# Altium footprint library texas.PCBLIB: 168 footprints (part 5 of 14)
Each footprint in its own frame and in the unit in brackets; x right, y up, seen from the top. Pads: shape width x height; smd on the part's side, far side on the other; paste and mask are expansions set on the pad; w line width, h text height; cw(c..) or ccw(c..) is an arc to the next point about the centre after c.
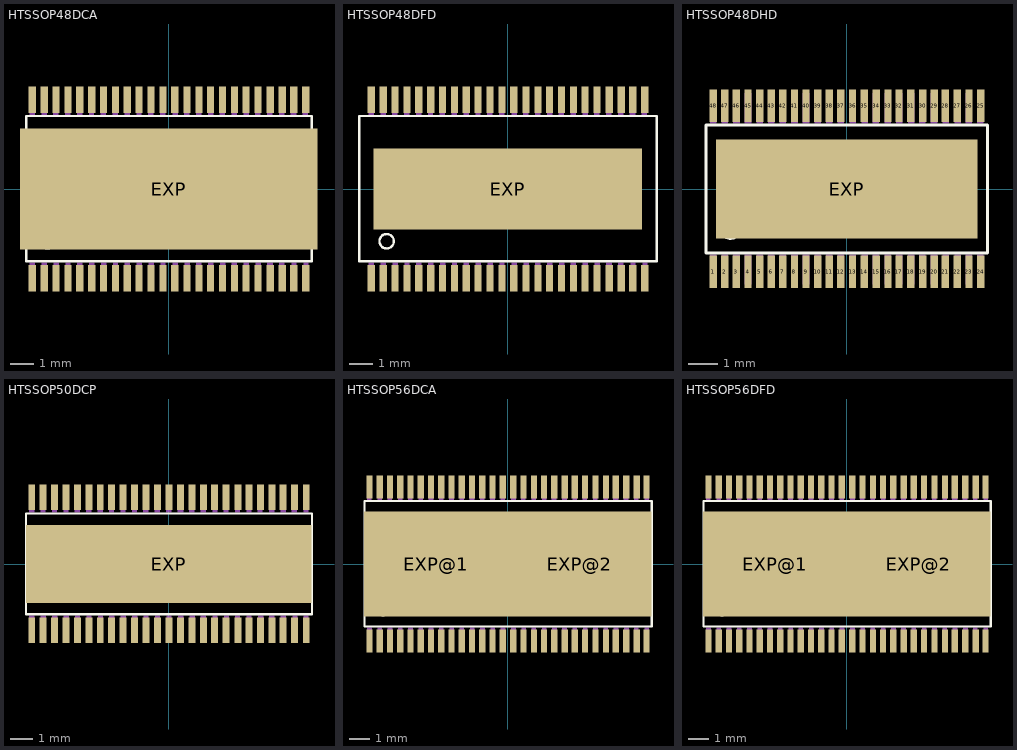
[diagram p4: the footprints below, top view; thin cyan lines are the x and y axes]

## HTSSOP48DCA [mil]
pads (49):
  rect 12x44 smd: 1(-226.38,-147.64) 2(-206.69,-147.64) 3(-187.01,-147.64) 4(-167.32,-147.64) 5(-147.64,-147.64) 6(-127.95,-147.64) 7(-108.27,-147.64) 8(-88.58,-147.64) 9(-68.9,-147.64) 10(-49.21,-147.64) 11(-29.53,-147.64) 12(-9.84,-147.64) 13(10,-147.64) 14(30,-147.64) 15(50,-147.64) 16(69,-147.64) 17(89,-147.64) 18(109,-147.64) 19(128,-147.64) 20(148,-147.64) 21(168,-147.64) 22(188,-147.64) 23(207,-147.64) 24(227,-147.64) 25(227,148) 26(207,148) 27(188,148) 28(168,148) 29(148,148) 30(128,148) 31(109,148) 32(89,148) 33(69,148) 34(50,148) 35(30,148) 36(10,148) 37(-9.84,148) 38(-29.53,148) 39(-49.21,148) 40(-68.9,148) 41(-88.58,148) 42(-108.27,148) 43(-127.95,148) 44(-147.64,148) 45(-167.32,148) 46(-187.01,148) 47(-206.69,148) 48(-226.38,148)
  rect 493x201 smd: EXP(0,0)
Top Overlay:
  circle w4: c-200.79,-86.61 r12
  lines w4: -236.22,-120.08 -236.22,121 237,121 237,-120.08 -236.22,-120.08
Top Paste:
  region: -220.87,169 -231.89,169 -231.89,127 -220.87,127
  region: -201.18,169 -212.2,169 -212.2,127 -201.18,127
  region: -181.5,169 -192.52,169 -192.52,127 -181.5,127
  region: -161.81,169 -172.83,169 -172.83,127 -161.81,127
  region: -142.13,169 -153.15,169 -153.15,127 -142.13,127
  region: -122.44,169 -133.46,169 -133.46,127 -122.44,127
  region: -102.76,169 -113.78,169 -113.78,127 -102.76,127
  region: -83.07,169 -94.09,169 -94.09,127 -83.07,127
  region: -63.39,169 -74.41,169 -74.41,127 -63.39,127
  region: -43.7,169 -54.72,169 -54.72,127 -43.7,127
  region: -24.02,169 -35.04,169 -35.04,127 -24.02,127
  region: -4.33,169 -15.35,169 -15.35,127 -4.33,127
  region: 16,169 5,169 5,127 16,127
  region: 36,169 25,169 25,127 36,127
  region: 55,169 44,169 44,127 55,127
  region: 75,169 64,169 64,127 75,127
  region: 95,169 84,169 84,127 95,127
  region: 114,169 103,169 103,127 114,127
  region: 134,169 123,169 123,127 134,127
  region: 154,169 143,169 143,127 154,127
  region: 173,169 162,169 162,127 173,127
  region: 193,169 182,169 182,127 193,127
  region: 213,169 202,169 202,127 213,127
  region: 232,169 221,169 221,127 232,127
  rectangle: 221,-168.7 232,-126.57
  rectangle: 202,-168.7 213,-126.57
  rectangle: 182,-168.7 193,-126.57
  rectangle: 162,-168.7 173,-126.57
  rectangle: 143,-168.7 154,-126.57
  rectangle: 123,-168.7 134,-126.57
  rectangle: 103,-168.7 114,-126.57
  rectangle: 84,-168.7 95,-126.57
  rectangle: 64,-168.7 75,-126.57
  rectangle: 44,-168.7 55,-126.57
  rectangle: 25,-168.7 36,-126.57
  rectangle: 5,-168.7 16,-126.57
  rectangle: -15.35,-168.7 -4.33,-126.57
  rectangle: -35.04,-168.7 -24.02,-126.57
  rectangle: -54.72,-168.7 -43.7,-126.57
  rectangle: -74.41,-168.7 -63.39,-126.57
  rectangle: -94.09,-168.7 -83.07,-126.57
  rectangle: -113.78,-168.7 -102.76,-126.57
  rectangle: -133.46,-168.7 -122.44,-126.57
  rectangle: -153.15,-168.7 -142.13,-126.57
  rectangle: -172.83,-168.7 -161.81,-126.57
  rectangle: -192.52,-168.7 -181.5,-126.57
  rectangle: -212.2,-168.7 -201.18,-126.57
  rectangle: -231.89,-168.7 -220.87,-126.57
Top Solder:
  rectangle: -245.87,-100.39 247,101
  region: -220.28,170 -232.48,170 -232.48,126 -220.28,126
  region: -200.59,170 -212.8,170 -212.8,126 -200.59,126
  region: -180.91,170 -193.11,170 -193.11,126 -180.91,126
  region: -161.22,170 -173.43,170 -173.43,126 -161.22,126
  region: -141.54,170 -153.74,170 -153.74,126 -141.54,126
  region: -121.85,170 -134.06,170 -134.06,126 -121.85,126
  region: -102.17,170 -114.37,170 -114.37,126 -102.17,126
  region: -82.48,170 -94.69,170 -94.69,126 -82.48,126
  region: -62.8,170 -75,170 -75,126 -62.8,126
  region: -43.11,170 -55.31,170 -55.31,126 -43.11,126
  region: -23.43,170 -35.63,170 -35.63,126 -23.43,126
  region: -3.74,170 -15.94,170 -15.94,126 -3.74,126
  region: 16,170 4,170 4,126 16,126
  region: 36,170 24,170 24,126 36,126
  region: 56,170 44,170 44,126 56,126
  region: 75,170 63,170 63,126 75,126
  region: 95,170 83,170 83,126 95,126
  region: 115,170 103,170 103,126 115,126
  region: 135,170 122,170 122,126 135,126
  region: 154,170 142,170 142,126 154,126
  region: 174,170 162,170 162,126 174,126
  region: 194,170 181,170 181,126 194,126
  region: 213,170 201,170 201,126 213,126
  region: 233,170 221,170 221,126 233,126
  rectangle: 221,-169.49 233,-125.79
  rectangle: 201,-169.49 213,-125.79
  rectangle: 181,-169.49 194,-125.79
  rectangle: 162,-169.49 174,-125.79
  rectangle: 142,-169.49 154,-125.79
  rectangle: 122,-169.49 135,-125.79
  rectangle: 103,-169.49 115,-125.79
  rectangle: 83,-169.49 95,-125.79
  rectangle: 63,-169.49 75,-125.79
  rectangle: 44,-169.49 56,-125.79
  rectangle: 24,-169.49 36,-125.79
  rectangle: 4,-169.49 16,-125.79
  rectangle: -15.94,-169.49 -3.74,-125.79
  rectangle: -35.63,-169.49 -23.43,-125.79
  rectangle: -55.31,-169.49 -43.11,-125.79
  rectangle: -75,-169.49 -62.8,-125.79
  rectangle: -94.69,-169.49 -82.48,-125.79
  rectangle: -114.37,-169.49 -102.17,-125.79
  rectangle: -134.06,-169.49 -121.85,-125.79
  rectangle: -153.74,-169.49 -141.54,-125.79
  rectangle: -173.43,-169.49 -161.22,-125.79
  rectangle: -193.11,-169.49 -180.91,-125.79
  rectangle: -212.8,-169.49 -200.59,-125.79
  rectangle: -232.48,-169.49 -220.28,-125.79
Mechanical 4:
  region: -222.05,164 -231.1,164 -231.1,122 -222.05,122
  region: -202.36,164 -211.42,164 -211.42,122 -202.36,122
  region: -182.68,164 -191.73,164 -191.73,122 -182.68,122
  region: -162.99,164 -172.05,164 -172.05,122 -162.99,122
  region: -143.31,164 -152.36,164 -152.36,122 -143.31,122
  region: -123.62,164 -132.68,164 -132.68,122 -123.62,122
  region: -103.94,164 -112.99,164 -112.99,122 -103.94,122
  region: -84.25,164 -93.31,164 -93.31,122 -84.25,122
  region: -64.57,164 -73.62,164 -73.62,122 -64.57,122
  region: -44.88,164 -53.94,164 -53.94,122 -44.88,122
  region: -25.2,164 -34.25,164 -34.25,122 -25.2,122
  region: -5.51,164 -14.57,164 -14.57,122 -5.51,122
  region: 15,164 6,164 6,122 15,122
  region: 34,164 25,164 25,122 34,122
  region: 54,164 45,164 45,122 54,122
  region: 74,164 65,164 65,122 74,122
  region: 93,164 84,164 84,122 93,122
  region: 113,164 104,164 104,122 113,122
  region: 133,164 124,164 124,122 133,122
  region: 152,164 143,164 143,122 152,122
  region: 172,164 163,164 163,122 172,122
  region: 192,164 183,164 183,122 192,122
  region: 212,164 202,164 202,122 212,122
  region: 231,164 222,164 222,122 231,122
  rectangle: 223,-163.39 232,-121.85
  rectangle: 203,-163.39 212,-121.85
  rectangle: 183,-163.39 192,-121.85
  rectangle: 163,-163.39 173,-121.85
  rectangle: 144,-163.39 153,-121.85
  rectangle: 124,-163.39 133,-121.85
  rectangle: 104,-163.39 113,-121.85
  rectangle: 85,-163.39 94,-121.85
  rectangle: 65,-163.39 74,-121.85
  rectangle: 45,-163.39 54,-121.85
  rectangle: 26,-163.39 35,-121.85
  rectangle: 6,-163.39 15,-121.85
  rectangle: -14.17,-163.39 -5.12,-121.85
  rectangle: -33.86,-163.39 -24.8,-121.85
  rectangle: -53.54,-163.39 -44.49,-121.85
  rectangle: -73.23,-163.39 -64.17,-121.85
  rectangle: -92.91,-163.39 -83.86,-121.85
  rectangle: -112.6,-163.39 -103.54,-121.85
  rectangle: -132.28,-163.39 -123.23,-121.85
  rectangle: -151.97,-163.39 -142.91,-121.85
  rectangle: -171.65,-163.39 -162.6,-121.85
  rectangle: -191.34,-163.39 -182.28,-121.85
  rectangle: -211.02,-163.39 -201.97,-121.85
  rectangle: -230.71,-163.39 -221.65,-121.85

## HTSSOP48DFD [mil]
pads (49):
  rect 12x44 smd: 1(-226.38,-147.64) 2(-206.69,-147.64) 3(-187.01,-147.64) 4(-167.32,-147.64) 5(-147.64,-147.64) 6(-127.95,-147.64) 7(-108.27,-147.64) 8(-88.58,-147.64) 9(-68.9,-147.64) 10(-49.21,-147.64) 11(-29.53,-147.64) 12(-9.84,-147.64) 13(10,-147.64) 14(30,-147.64) 15(50,-147.64) 16(69,-147.64) 17(89,-147.64) 18(109,-147.64) 19(128,-147.64) 20(148,-147.64) 21(168,-147.64) 22(188,-147.64) 23(207,-147.64) 24(227,-147.64) 25(227,148) 26(207,148) 27(188,148) 28(168,148) 29(148,148) 30(128,148) 31(109,148) 32(89,148) 33(69,148) 34(50,148) 35(30,148) 36(10,148) 37(-9.84,148) 38(-29.53,148) 39(-49.21,148) 40(-68.9,148) 41(-88.58,148) 42(-108.27,148) 43(-127.95,148) 44(-147.64,148) 45(-167.32,148) 46(-187.01,148) 47(-206.69,148) 48(-226.38,148)
  rect 445x134 smd: EXP(0,0)
Top Overlay:
  circle w4: c-200.79,-86.61 r12
  lines w4: -246.06,-120.08 -246.06,121 247,121 247,-120.08 -246.06,-120.08
Top Paste:
  region: -220.87,169 -231.89,169 -231.89,127 -220.87,127
  region: -201.18,169 -212.2,169 -212.2,127 -201.18,127
  region: -181.5,169 -192.52,169 -192.52,127 -181.5,127
  region: -161.81,169 -172.83,169 -172.83,127 -161.81,127
  region: -142.13,169 -153.15,169 -153.15,127 -142.13,127
  region: -122.44,169 -133.46,169 -133.46,127 -122.44,127
  region: -102.76,169 -113.78,169 -113.78,127 -102.76,127
  region: -83.07,169 -94.09,169 -94.09,127 -83.07,127
  region: -63.39,169 -74.41,169 -74.41,127 -63.39,127
  region: -43.7,169 -54.72,169 -54.72,127 -43.7,127
  region: -24.02,169 -35.04,169 -35.04,127 -24.02,127
  region: -4.33,169 -15.35,169 -15.35,127 -4.33,127
  region: 16,169 5,169 5,127 16,127
  region: 36,169 25,169 25,127 36,127
  region: 55,169 44,169 44,127 55,127
  region: 75,169 64,169 64,127 75,127
  region: 95,169 84,169 84,127 95,127
  region: 114,169 103,169 103,127 114,127
  region: 134,169 123,169 123,127 134,127
  region: 154,169 143,169 143,127 154,127
  region: 173,169 162,169 162,127 173,127
  region: 193,169 182,169 182,127 193,127
  region: 213,169 202,169 202,127 213,127
  region: 232,169 221,169 221,127 232,127
  rectangle: 221,-168.7 232,-126.57
  rectangle: 202,-168.7 213,-126.57
  rectangle: 182,-168.7 193,-126.57
  rectangle: 162,-168.7 173,-126.57
  rectangle: 143,-168.7 154,-126.57
  rectangle: 123,-168.7 134,-126.57
  rectangle: 103,-168.7 114,-126.57
  rectangle: 84,-168.7 95,-126.57
  rectangle: 64,-168.7 75,-126.57
  rectangle: 44,-168.7 55,-126.57
  rectangle: 25,-168.7 36,-126.57
  rectangle: 5,-168.7 16,-126.57
  rectangle: -15.35,-168.7 -4.33,-126.57
  rectangle: -35.04,-168.7 -24.02,-126.57
  rectangle: -54.72,-168.7 -43.7,-126.57
  rectangle: -74.41,-168.7 -63.39,-126.57
  rectangle: -94.09,-168.7 -83.07,-126.57
  rectangle: -113.78,-168.7 -102.76,-126.57
  rectangle: -133.46,-168.7 -122.44,-126.57
  rectangle: -153.15,-168.7 -142.13,-126.57
  rectangle: -172.83,-168.7 -161.81,-126.57
  rectangle: -192.52,-168.7 -181.5,-126.57
  rectangle: -212.2,-168.7 -201.18,-126.57
  rectangle: -231.89,-168.7 -220.87,-126.57
Top Solder:
  rectangle: -222.44,-66.93 223,67
  region: -220.28,170 -232.48,170 -232.48,126 -220.28,126
  region: -200.59,170 -212.8,170 -212.8,126 -200.59,126
  region: -180.91,170 -193.11,170 -193.11,126 -180.91,126
  region: -161.22,170 -173.43,170 -173.43,126 -161.22,126
  region: -141.54,170 -153.74,170 -153.74,126 -141.54,126
  region: -121.85,170 -134.06,170 -134.06,126 -121.85,126
  region: -102.17,170 -114.37,170 -114.37,126 -102.17,126
  region: -82.48,170 -94.69,170 -94.69,126 -82.48,126
  region: -62.8,170 -75,170 -75,126 -62.8,126
  region: -43.11,170 -55.31,170 -55.31,126 -43.11,126
  region: -23.43,170 -35.63,170 -35.63,126 -23.43,126
  region: -3.74,170 -15.94,170 -15.94,126 -3.74,126
  region: 16,170 4,170 4,126 16,126
  region: 36,170 24,170 24,126 36,126
  region: 56,170 44,170 44,126 56,126
  region: 75,170 63,170 63,126 75,126
  region: 95,170 83,170 83,126 95,126
  region: 115,170 103,170 103,126 115,126
  region: 135,170 122,170 122,126 135,126
  region: 154,170 142,170 142,126 154,126
  region: 174,170 162,170 162,126 174,126
  region: 194,170 181,170 181,126 194,126
  region: 213,170 201,170 201,126 213,126
  region: 233,170 221,170 221,126 233,126
  rectangle: 221,-169.49 233,-125.79
  rectangle: 201,-169.49 213,-125.79
  rectangle: 181,-169.49 194,-125.79
  rectangle: 162,-169.49 174,-125.79
  rectangle: 142,-169.49 154,-125.79
  rectangle: 122,-169.49 135,-125.79
  rectangle: 103,-169.49 115,-125.79
  rectangle: 83,-169.49 95,-125.79
  rectangle: 63,-169.49 75,-125.79
  rectangle: 44,-169.49 56,-125.79
  rectangle: 24,-169.49 36,-125.79
  rectangle: 4,-169.49 16,-125.79
  rectangle: -15.94,-169.49 -3.74,-125.79
  rectangle: -35.63,-169.49 -23.43,-125.79
  rectangle: -55.31,-169.49 -43.11,-125.79
  rectangle: -75,-169.49 -62.8,-125.79
  rectangle: -94.69,-169.49 -82.48,-125.79
  rectangle: -114.37,-169.49 -102.17,-125.79
  rectangle: -134.06,-169.49 -121.85,-125.79
  rectangle: -153.74,-169.49 -141.54,-125.79
  rectangle: -173.43,-169.49 -161.22,-125.79
  rectangle: -193.11,-169.49 -180.91,-125.79
  rectangle: -212.8,-169.49 -200.59,-125.79
  rectangle: -232.48,-169.49 -220.28,-125.79
Mechanical 4:
  region: -222.05,164 -231.1,164 -231.1,122 -222.05,122
  region: -202.36,164 -211.42,164 -211.42,122 -202.36,122
  region: -182.68,164 -191.73,164 -191.73,122 -182.68,122
  region: -162.99,164 -172.05,164 -172.05,122 -162.99,122
  region: -143.31,164 -152.36,164 -152.36,122 -143.31,122
  region: -123.62,164 -132.68,164 -132.68,122 -123.62,122
  region: -103.94,164 -112.99,164 -112.99,122 -103.94,122
  region: -84.25,164 -93.31,164 -93.31,122 -84.25,122
  region: -64.57,164 -73.62,164 -73.62,122 -64.57,122
  region: -44.88,164 -53.94,164 -53.94,122 -44.88,122
  region: -25.2,164 -34.25,164 -34.25,122 -25.2,122
  region: -5.51,164 -14.57,164 -14.57,122 -5.51,122
  region: 15,164 6,164 6,122 15,122
  region: 34,164 25,164 25,122 34,122
  region: 54,164 45,164 45,122 54,122
  region: 74,164 65,164 65,122 74,122
  region: 93,164 84,164 84,122 93,122
  region: 113,164 104,164 104,122 113,122
  region: 133,164 124,164 124,122 133,122
  region: 152,164 143,164 143,122 152,122
  region: 172,164 163,164 163,122 172,122
  region: 192,164 183,164 183,122 192,122
  region: 212,164 202,164 202,122 212,122
  region: 231,164 222,164 222,122 231,122
  rectangle: 223,-163.39 232,-121.85
  rectangle: 203,-163.39 212,-121.85
  rectangle: 183,-163.39 192,-121.85
  rectangle: 163,-163.39 173,-121.85
  rectangle: 144,-163.39 153,-121.85
  rectangle: 124,-163.39 133,-121.85
  rectangle: 104,-163.39 113,-121.85
  rectangle: 85,-163.39 94,-121.85
  rectangle: 65,-163.39 74,-121.85
  rectangle: 45,-163.39 54,-121.85
  rectangle: 26,-163.39 35,-121.85
  rectangle: 6,-163.39 15,-121.85
  rectangle: -14.17,-163.39 -5.12,-121.85
  rectangle: -33.86,-163.39 -24.8,-121.85
  rectangle: -53.54,-163.39 -44.49,-121.85
  rectangle: -73.23,-163.39 -64.17,-121.85
  rectangle: -92.91,-163.39 -83.86,-121.85
  rectangle: -112.6,-163.39 -103.54,-121.85
  rectangle: -132.28,-163.39 -123.23,-121.85
  rectangle: -151.97,-163.39 -142.91,-121.85
  rectangle: -171.65,-163.39 -162.6,-121.85
  rectangle: -191.34,-163.39 -182.28,-121.85
  rectangle: -211.02,-163.39 -201.97,-121.85
  rectangle: -230.71,-163.39 -221.65,-121.85

## HTSSOP48DHD [mil]
pads (49):
  rect 10x44 smd: 1(-181.1,-112.2) 2(-165.35,-112.2) 3(-149.61,-112.2) 4(-133.86,-112.2) 5(-118.11,-112.2) 6(-102.36,-112.2) 7(-86.61,-112.2) 8(-70.87,-112.2) 9(-55.12,-112.2) 10(-39.37,-112.2) 11(-23.62,-112.2) 12(-7.87,-112.2) 13(8,-112.2) 14(24,-112.2) 15(40,-112.2) 16(56,-112.2) 17(71,-112.2) 18(87,-112.2) 19(103,-112.2) 20(119,-112.2) 21(134,-112.2) 22(150,-112.2) 23(166,-112.2) 24(182,-112.2) 25(182,113) 26(166,113) 27(150,113) 28(134,113) 29(119,113) 30(103,113) 31(87,113) 32(71,113) 33(56,113) 34(40,113) 35(24,113) 36(8,113) 37(-7.87,113) 38(-23.62,113) 39(-39.37,113) 40(-55.12,113) 41(-70.87,113) 42(-86.61,113) 43(-102.36,113) 44(-118.11,113) 45(-133.86,113) 46(-149.61,113) 47(-165.35,113) 48(-181.1,113)
  rect 355x134 smd: EXP(0,0)
Top Overlay:
  circle w4: c-157.48,-55.12 r12
  lines w4: -190.94,-86.61 -190.94,87 191,87 191,-86.61 -190.94,-86.61
Top Paste:
  region: -176.77,134 -185.43,134 -185.43,92 -176.77,92
  region: -161.02,134 -169.69,134 -169.69,92 -161.02,92
  region: -145.28,134 -153.94,134 -153.94,92 -145.28,92
  region: -129.53,134 -138.19,134 -138.19,92 -129.53,92
  region: -113.78,134 -122.44,134 -122.44,92 -113.78,92
  region: -98.03,134 -106.69,134 -106.69,92 -98.03,92
  region: -82.28,134 -90.94,134 -90.94,92 -82.28,92
  region: -66.54,134 -75.2,134 -75.2,92 -66.54,92
  region: -50.79,134 -59.45,134 -59.45,92 -50.79,92
  region: -35.04,134 -43.7,134 -43.7,92 -35.04,92
  region: -19.29,134 -27.95,134 -27.95,92 -19.29,92
  region: -3.54,134 -12.2,134 -12.2,92 -3.54,92
  region: 13,134 4,134 4,92 13,92
  region: 28,134 20,134 20,92 28,92
  region: 44,134 36,134 36,92 44,92
  region: 60,134 51,134 51,92 60,92
  region: 76,134 67,134 67,92 76,92
  region: 91,134 83,134 83,92 91,92
  region: 107,134 99,134 99,92 107,92
  region: 123,134 114,134 114,92 123,92
  region: 139,134 130,134 130,92 139,92
  region: 154,134 146,134 146,92 154,92
  region: 170,134 162,134 162,92 170,92
  region: 186,134 177,134 177,92 186,92
  rectangle: 177,-133.27 186,-91.34
  rectangle: 162,-133.27 170,-91.34
  rectangle: 146,-133.27 154,-91.34
  rectangle: 130,-133.27 139,-91.34
  rectangle: 114,-133.27 123,-91.34
  rectangle: 99,-133.27 107,-91.34
  rectangle: 83,-133.27 91,-91.34
  rectangle: 67,-133.27 76,-91.34
  rectangle: 51,-133.27 60,-91.34
  rectangle: 36,-133.27 44,-91.34
  rectangle: 20,-133.27 28,-91.34
  rectangle: 4,-133.27 13,-91.34
  rectangle: -12.2,-133.27 -3.54,-91.34
  rectangle: -27.95,-133.27 -19.29,-91.34
  rectangle: -43.7,-133.27 -35.04,-91.34
  rectangle: -59.45,-133.27 -50.79,-91.34
  rectangle: -75.2,-133.27 -66.54,-91.34
  rectangle: -90.94,-133.27 -82.28,-91.34
  rectangle: -106.69,-133.27 -98.03,-91.34
  rectangle: -122.44,-133.27 -113.78,-91.34
  rectangle: -138.19,-133.27 -129.53,-91.34
  rectangle: -153.94,-133.27 -145.28,-91.34
  rectangle: -169.69,-133.27 -161.02,-91.34
  rectangle: -185.43,-133.27 -176.77,-91.34
Top Solder:
  rectangle: -177.17,-66.93 178,67
  region: -175.98,135 -186.22,135 -186.22,91 -175.98,91
  region: -160.24,135 -170.47,135 -170.47,91 -160.24,91
  region: -144.49,135 -154.72,135 -154.72,91 -144.49,91
  region: -128.74,135 -138.98,135 -138.98,91 -128.74,91
  region: -112.99,135 -123.23,135 -123.23,91 -112.99,91
  region: -97.24,135 -107.48,135 -107.48,91 -97.24,91
  region: -81.5,135 -91.73,135 -91.73,91 -81.5,91
  region: -65.75,135 -75.98,135 -75.98,91 -65.75,91
  region: -50,135 -60.24,135 -60.24,91 -50,91
  region: -34.25,135 -44.49,135 -44.49,91 -34.25,91
  region: -18.5,135 -28.74,135 -28.74,91 -18.5,91
  region: -2.76,135 -12.99,135 -12.99,91 -2.76,91
  region: 13,135 3,135 3,91 13,91
  region: 29,135 19,135 19,91 29,91
  region: 45,135 35,135 35,91 45,91
  region: 61,135 50,135 50,91 61,91
  region: 76,135 66,135 66,91 76,91
  region: 92,135 82,135 82,91 92,91
  region: 108,135 98,135 98,91 108,91
  region: 124,135 113,135 113,91 124,91
  region: 139,135 129,135 129,91 139,91
  region: 155,135 145,135 145,91 155,91
  region: 171,135 161,135 161,91 171,91
  region: 187,135 176,135 176,91 187,91
  rectangle: 176,-134.06 187,-90.35
  rectangle: 161,-134.06 171,-90.35
  rectangle: 145,-134.06 155,-90.35
  rectangle: 129,-134.06 139,-90.35
  rectangle: 113,-134.06 124,-90.35
  rectangle: 98,-134.06 108,-90.35
  rectangle: 82,-134.06 92,-90.35
  rectangle: 66,-134.06 76,-90.35
  rectangle: 50,-134.06 61,-90.35
  rectangle: 35,-134.06 45,-90.35
  rectangle: 19,-134.06 29,-90.35
  rectangle: 3,-134.06 13,-90.35
  rectangle: -12.99,-134.06 -2.76,-90.35
  rectangle: -28.74,-134.06 -18.5,-90.35
  rectangle: -44.49,-134.06 -34.25,-90.35
  rectangle: -60.24,-134.06 -50,-90.35
  rectangle: -75.98,-134.06 -65.75,-90.35
  rectangle: -91.73,-134.06 -81.5,-90.35
  rectangle: -107.48,-134.06 -97.24,-90.35
  rectangle: -123.23,-134.06 -112.99,-90.35
  rectangle: -138.98,-134.06 -128.74,-90.35
  rectangle: -154.72,-134.06 -144.49,-90.35
  rectangle: -170.47,-134.06 -160.24,-90.35
  rectangle: -186.22,-134.06 -175.98,-90.35
Mechanical 4:
  region: -176.57,130 -185.63,130 -185.63,89 -176.57,89
  region: -160.83,130 -169.88,130 -169.88,89 -160.83,89
  region: -145.08,130 -154.13,130 -154.13,89 -145.08,89
  region: -129.33,130 -138.39,130 -138.39,89 -129.33,89
  region: -113.58,130 -122.64,130 -122.64,89 -113.58,89
  region: -97.83,130 -106.89,130 -106.89,89 -97.83,89
  region: -82.09,130 -91.14,130 -91.14,89 -82.09,89
  region: -66.34,130 -75.39,130 -75.39,89 -66.34,89
  region: -50.59,130 -59.65,130 -59.65,89 -50.59,89
  region: -34.84,130 -43.9,130 -43.9,89 -34.84,89
  region: -19.09,130 -28.15,130 -28.15,89 -19.09,89
  region: -3.35,130 -12.4,130 -12.4,89 -3.35,89
  region: 13,130 4,130 4,89 13,89
  region: 29,130 20,130 20,89 29,89
  region: 44,130 35,130 35,89 44,89
  region: 60,130 51,130 51,89 60,89
  region: 76,130 67,130 67,89 76,89
  region: 92,130 83,130 83,89 92,89
  region: 107,130 98,130 98,89 107,89
  region: 123,130 114,130 114,89 123,89
  region: 139,130 130,130 130,89 139,89
  region: 155,130 146,130 146,89 155,89
  region: 170,130 161,130 161,89 170,89
  region: 186,130 177,130 177,89 186,89
  rectangle: 177,-129.92 186,-88.58
  rectangle: 161,-129.92 170,-88.58
  rectangle: 146,-129.92 155,-88.58
  rectangle: 130,-129.92 139,-88.58
  rectangle: 114,-129.92 123,-88.58
  rectangle: 98,-129.92 107,-88.58
  rectangle: 83,-129.92 92,-88.58
  rectangle: 67,-129.92 76,-88.58
  rectangle: 51,-129.92 60,-88.58
  rectangle: 35,-129.92 44,-88.58
  rectangle: 20,-129.92 29,-88.58
  rectangle: 4,-129.92 13,-88.58
  rectangle: -12.4,-129.92 -3.35,-88.58
  rectangle: -28.15,-129.92 -19.09,-88.58
  rectangle: -43.9,-129.92 -34.84,-88.58
  rectangle: -59.65,-129.92 -50.59,-88.58
  rectangle: -75.39,-129.92 -66.34,-88.58
  rectangle: -91.14,-129.92 -82.09,-88.58
  rectangle: -106.89,-129.92 -97.83,-88.58
  rectangle: -122.64,-129.92 -113.58,-88.58
  rectangle: -138.39,-129.92 -129.33,-88.58
  rectangle: -154.13,-129.92 -145.08,-88.58
  rectangle: -169.88,-129.92 -160.83,-88.58
  rectangle: -185.63,-129.92 -176.57,-88.58

## HTSSOP50DCP [mil]
pads (51):
  rect 12x44 smd: 1(-236.22,-114.17) 2(-216.54,-114.17) 3(-196.85,-114.17) 4(-177.17,-114.17) 5(-157.48,-114.17) 6(-137.8,-114.17) 7(-118.11,-114.17) 8(-98.43,-114.17) 9(-78.74,-114.17) 10(-59.06,-114.17) 11(-39.37,-114.17) 12(-19.68,-114.17) 13(0,-114.17) 14(20,-114.17) 15(40,-114.17) 16(60,-114.17) 17(79,-114.17) 18(99,-114.17) 19(119,-114.17) 20(138,-114.17) 21(158,-114.17) 22(178,-114.17) 23(197,-114.17) 24(217,-114.17) 25(237,-114.17) 26(237,115) 27(217,115) 28(197,115) 29(178,115) 30(158,115) 31(138,115) 32(119,115) 33(99,115) 34(79,115) 35(60,115) 36(40,115) 37(20,115) 38(0,115) 39(-19.68,115) 40(-39.37,115) 41(-59.06,115) 42(-78.74,115) 43(-98.43,115) 44(-118.11,115) 45(-137.8,115) 46(-157.48,115) 47(-177.17,115) 48(-196.85,115) 49(-216.54,115) 50(-236.22,115)
  rect 493x134 smd: EXP(0,0)
Top Overlay:
  circle w4: c-224.21,-53.15 r12
  lines w4: -246.06,-86.61 -246.06,87 247,87 247,-86.61 -246.06,-86.61
Top Paste:
  region: -230.71,136 -241.73,136 -241.73,94 -230.71,94
  region: -211.02,136 -222.05,136 -222.05,94 -211.02,94
  region: -191.34,136 -202.36,136 -202.36,94 -191.34,94
  region: -171.65,136 -182.68,136 -182.68,94 -171.65,94
  region: -151.97,136 -162.99,136 -162.99,94 -151.97,94
  region: -132.28,136 -143.31,136 -143.31,94 -132.28,94
  region: -112.6,136 -123.62,136 -123.62,94 -112.6,94
  region: -92.91,136 -103.94,136 -103.94,94 -92.91,94
  region: -73.23,136 -84.25,136 -84.25,94 -73.23,94
  region: -53.54,136 -64.57,136 -64.57,94 -53.54,94
  region: -33.86,136 -44.88,136 -44.88,94 -33.86,94
  region: -14.17,136 -25.2,136 -25.2,94 -14.17,94
  region: 6,136 -5.51,136 -5.51,94 6,94
  region: 26,136 15,136 15,94 26,94
  region: 45,136 34,136 34,94 45,94
  region: 65,136 54,136 54,94 65,94
  region: 85,136 74,136 74,94 85,94
  region: 104,136 93,136 93,94 104,94
  region: 124,136 113,136 113,94 124,94
  region: 144,136 133,136 133,94 144,94
  region: 163,136 152,136 152,94 163,94
  region: 183,136 172,136 172,94 183,94
  region: 203,136 192,136 192,94 203,94
  region: 223,136 212,136 212,94 223,94
  region: 242,136 231,136 231,94 242,94
  rectangle: 231,-135.24 242,-93.11
  rectangle: 212,-135.24 223,-93.11
  rectangle: 192,-135.24 203,-93.11
  rectangle: 172,-135.24 183,-93.11
  rectangle: 152,-135.24 163,-93.11
  rectangle: 133,-135.24 144,-93.11
  rectangle: 113,-135.24 124,-93.11
  rectangle: 93,-135.24 104,-93.11
  rectangle: 74,-135.24 85,-93.11
  rectangle: 54,-135.24 65,-93.11
  rectangle: 34,-135.24 45,-93.11
  rectangle: 15,-135.24 26,-93.11
  rectangle: -5.51,-135.24 6,-93.11
  rectangle: -25.2,-135.24 -14.17,-93.11
  rectangle: -44.88,-135.24 -33.86,-93.11
  rectangle: -64.57,-135.24 -53.54,-93.11
  rectangle: -84.25,-135.24 -73.23,-93.11
  rectangle: -103.94,-135.24 -92.91,-93.11
  rectangle: -123.62,-135.24 -112.6,-93.11
  rectangle: -143.31,-135.24 -132.28,-93.11
  rectangle: -162.99,-135.24 -151.97,-93.11
  rectangle: -182.68,-135.24 -171.65,-93.11
  rectangle: -202.36,-135.24 -191.34,-93.11
  rectangle: -222.05,-135.24 -211.02,-93.11
  rectangle: -241.73,-135.24 -230.71,-93.11
Top Solder:
  region: -230.12,137 -242.32,137 -242.32,93 -230.12,93
  region: -210.43,137 -222.64,137 -222.64,93 -210.43,93
  region: -190.75,137 -202.95,137 -202.95,93 -190.75,93
  region: -171.06,137 -183.27,137 -183.27,93 -171.06,93
  region: -151.38,137 -163.58,137 -163.58,93 -151.38,93
  region: -131.69,137 -143.9,137 -143.9,93 -131.69,93
  region: -112.01,137 -124.21,137 -124.21,93 -112.01,93
  region: -92.32,137 -104.53,137 -104.53,93 -92.32,93
  region: -72.64,137 -84.84,137 -84.84,93 -72.64,93
  region: -52.95,137 -65.16,137 -65.16,93 -52.95,93
  region: -33.27,137 -45.47,137 -45.47,93 -33.27,93
  region: -13.58,137 -25.79,137 -25.79,93 -13.58,93
  region: 7,137 -6.1,137 -6.1,93 7,93
  region: 26,137 14,137 14,93 26,93
  region: 46,137 34,137 34,93 46,93
  region: 66,137 53,137 53,93 66,93
  region: 85,137 73,137 73,93 85,93
  region: 105,137 93,137 93,93 105,93
  region: 125,137 113,137 113,93 125,93
  region: 144,137 132,137 132,93 144,93
  region: 164,137 152,137 152,93 164,93
  region: 184,137 172,137 172,93 184,93
  rectangle: -246.06,-66.93 247,67
  region: 203,137 191,137 191,93 203,93
  region: 223,137 211,137 211,93 223,93
  region: 243,137 231,137 231,93 243,93
  rectangle: 231,-136.02 243,-92.32
  rectangle: 211,-136.02 223,-92.32
  rectangle: 191,-136.02 203,-92.32
  rectangle: 172,-136.02 184,-92.32
  rectangle: 152,-136.02 164,-92.32
  rectangle: 132,-136.02 144,-92.32
  rectangle: 113,-136.02 125,-92.32
  rectangle: 93,-136.02 105,-92.32
  rectangle: 73,-136.02 85,-92.32
  rectangle: 53,-136.02 66,-92.32
  rectangle: 34,-136.02 46,-92.32
  rectangle: 14,-136.02 26,-92.32
  rectangle: -6.1,-136.02 7,-92.32
  rectangle: -25.79,-136.02 -13.58,-92.32
  rectangle: -45.47,-136.02 -33.27,-92.32
  rectangle: -65.16,-136.02 -52.95,-92.32
  rectangle: -84.84,-136.02 -72.64,-92.32
  rectangle: -104.53,-136.02 -92.32,-92.32
  rectangle: -124.21,-136.02 -112.01,-92.32
  rectangle: -143.9,-136.02 -131.69,-92.32
  rectangle: -163.58,-136.02 -151.38,-92.32
  rectangle: -183.27,-136.02 -171.06,-92.32
  rectangle: -202.95,-136.02 -190.75,-92.32
  rectangle: -222.64,-136.02 -210.43,-92.32
  rectangle: -242.32,-136.02 -230.12,-92.32
Mechanical 4:
  region: -231.89,130 -240.94,130 -240.94,89 -231.89,89
  region: -212.2,130 -221.26,130 -221.26,89 -212.2,89
  region: -192.52,130 -201.57,130 -201.57,89 -192.52,89
  region: -172.83,130 -181.89,130 -181.89,89 -172.83,89
  region: -153.15,130 -162.2,130 -162.2,89 -153.15,89
  region: -133.46,130 -142.52,130 -142.52,89 -133.46,89
  region: -113.78,130 -122.83,130 -122.83,89 -113.78,89
  region: -94.09,130 -103.15,130 -103.15,89 -94.09,89
  region: -74.41,130 -83.46,130 -83.46,89 -74.41,89
  region: -54.72,130 -63.78,130 -63.78,89 -54.72,89
  region: -35.04,130 -44.09,130 -44.09,89 -35.04,89
  region: -15.35,130 -24.41,130 -24.41,89 -15.35,89
  region: 5,130 -4.72,130 -4.72,89 5,89
  region: 25,130 15,130 15,89 25,89
  region: 44,130 35,130 35,89 44,89
  region: 64,130 55,130 55,89 64,89
  region: 84,130 75,130 75,89 84,89
  region: 103,130 94,130 94,89 103,89
  region: 123,130 114,130 114,89 123,89
  region: 143,130 134,130 134,89 143,89
  region: 162,130 153,130 153,89 162,89
  region: 182,130 173,130 173,89 182,89
  region: 202,130 193,130 193,89 202,89
  region: 221,130 212,130 212,89 221,89
  region: 241,130 232,130 232,89 241,89
  rectangle: 232,-129.92 241,-88.39
  rectangle: 213,-129.92 222,-88.39
  rectangle: 193,-129.92 202,-88.39
  rectangle: 173,-129.92 182,-88.39
  rectangle: 154,-129.92 163,-88.39
  rectangle: 134,-129.92 143,-88.39
  rectangle: 114,-129.92 123,-88.39
  rectangle: 95,-129.92 104,-88.39
  rectangle: 75,-129.92 84,-88.39
  rectangle: 55,-129.92 64,-88.39
  rectangle: 36,-129.92 45,-88.39
  rectangle: 16,-129.92 25,-88.39
  rectangle: -4.33,-129.92 5,-88.39
  rectangle: -24.02,-129.92 -14.96,-88.39
  rectangle: -43.7,-129.92 -34.65,-88.39
  rectangle: -63.39,-129.92 -54.33,-88.39
  rectangle: -83.07,-129.92 -74.02,-88.39
  rectangle: -102.76,-129.92 -93.7,-88.39
  rectangle: -122.44,-129.92 -113.39,-88.39
  rectangle: -142.13,-129.92 -133.07,-88.39
  rectangle: -161.81,-129.92 -152.76,-88.39
  rectangle: -181.5,-129.92 -172.44,-88.39
  rectangle: -201.18,-129.92 -192.13,-88.39
  rectangle: -220.87,-129.92 -211.81,-88.39
  rectangle: -240.55,-129.92 -231.5,-88.39

## HTSSOP56DCA [mil]
pads (58):
  rect 12x44 smd: 1(-265.75,-147.64) 2(-246.06,-147.64) 3(-226.38,-147.64) 4(-206.69,-147.64) 5(-187.01,-147.64) 6(-167.32,-147.64) 7(-147.64,-147.64) 8(-127.95,-147.64) 9(-108.27,-147.64) 10(-88.58,-147.64) 11(-68.9,-147.64) 12(-49.21,-147.64) 13(-29.53,-147.64) 14(-9.84,-147.64) 15(10,-147.64) 16(30,-147.64) 17(50,-147.64) 18(69,-147.64) 19(89,-147.64) 20(109,-147.64) 21(128,-147.64) 22(148,-147.64) 23(168,-147.64) 24(188,-147.64) 25(207,-147.64) 26(227,-147.64) 27(247,-147.64) 28(266,-147.64) 29(266,148) 30(247,148) 31(227,148) 32(207,148) 33(188,148) 34(168,148) 35(148,148) 36(128,148) 37(109,148) 38(89,148) 39(69,148) 40(50,148) 41(30,148) 42(10,148) 43(-9.84,148) 44(-29.53,148) 45(-49.21,148) 46(-68.9,148) 47(-88.58,148) 48(-108.27,148) 49(-127.95,148) 50(-147.64,148) 51(-167.32,148) 52(-187.01,148) 53(-206.69,148) 54(-226.38,148) 55(-246.06,148) 56(-265.75,148)
  rect 276x201 smd: EXP@1(-137.8,0) EXP@2(138,0)
Top Overlay:
  circle w4: c-240.16,-86.61 r12
  lines w4: -275.59,-120.08 -275.59,121 276,121 276,-120.08 -275.59,-120.08
Top Paste:
  region: -260.24,169 -271.26,169 -271.26,127 -260.24,127
  region: -240.55,169 -251.57,169 -251.57,127 -240.55,127
  region: -220.87,169 -231.89,169 -231.89,127 -220.87,127
  region: -201.18,169 -212.2,169 -212.2,127 -201.18,127
  region: -181.5,169 -192.52,169 -192.52,127 -181.5,127
  region: -161.81,169 -172.83,169 -172.83,127 -161.81,127
  region: -142.13,169 -153.15,169 -153.15,127 -142.13,127
  region: -122.44,169 -133.46,169 -133.46,127 -122.44,127
  region: -102.76,169 -113.78,169 -113.78,127 -102.76,127
  region: -83.07,169 -94.09,169 -94.09,127 -83.07,127
  region: -63.39,169 -74.41,169 -74.41,127 -63.39,127
  region: -43.7,169 -54.72,169 -54.72,127 -43.7,127
  region: -24.02,169 -35.04,169 -35.04,127 -24.02,127
  region: -4.33,169 -15.35,169 -15.35,127 -4.33,127
  region: 16,169 5,169 5,127 16,127
  region: 36,169 25,169 25,127 36,127
  region: 55,169 44,169 44,127 55,127
  region: 75,169 64,169 64,127 75,127
  region: 95,169 84,169 84,127 95,127
  region: 114,169 103,169 103,127 114,127
  region: 134,169 123,169 123,127 134,127
  region: 154,169 143,169 143,127 154,127
  region: 173,169 162,169 162,127 173,127
  region: 193,169 182,169 182,127 193,127
  region: 213,169 202,169 202,127 213,127
  region: 232,169 221,169 221,127 232,127
  region: 252,169 241,169 241,127 252,127
  region: 272,169 261,169 261,127 272,127
  rectangle: 261,-168.7 272,-126.57
  rectangle: 241,-168.7 252,-126.57
  rectangle: 221,-168.7 232,-126.57
  rectangle: 202,-168.7 213,-126.57
  rectangle: 182,-168.7 193,-126.57
  rectangle: 162,-168.7 173,-126.57
  rectangle: 143,-168.7 154,-126.57
  rectangle: 123,-168.7 134,-126.57
  rectangle: 103,-168.7 114,-126.57
  rectangle: 84,-168.7 95,-126.57
  rectangle: 64,-168.7 75,-126.57
  rectangle: 44,-168.7 55,-126.57
  rectangle: 25,-168.7 36,-126.57
  rectangle: 5,-168.7 16,-126.57
  rectangle: -15.35,-168.7 -4.33,-126.57
  rectangle: -35.04,-168.7 -24.02,-126.57
  rectangle: -54.72,-168.7 -43.7,-126.57
  rectangle: -74.41,-168.7 -63.39,-126.57
  rectangle: -94.09,-168.7 -83.07,-126.57
  rectangle: -113.78,-168.7 -102.76,-126.57
  rectangle: -133.46,-168.7 -122.44,-126.57
  rectangle: -153.15,-168.7 -142.13,-126.57
  rectangle: -172.83,-168.7 -161.81,-126.57
  rectangle: -192.52,-168.7 -181.5,-126.57
  rectangle: -212.2,-168.7 -201.18,-126.57
  rectangle: -231.89,-168.7 -220.87,-126.57
  rectangle: -251.57,-168.7 -240.55,-126.57
  rectangle: -271.26,-168.7 -260.24,-126.57
Top Solder:
  rectangle: -275.39,-100.39 276,101
  region: -259.65,170 -271.85,170 -271.85,126 -259.65,126
  region: -239.96,170 -252.17,170 -252.17,126 -239.96,126
  region: -220.28,170 -232.48,170 -232.48,126 -220.28,126
  region: -200.59,170 -212.8,170 -212.8,126 -200.59,126
  region: -180.91,170 -193.11,170 -193.11,126 -180.91,126
  region: -161.22,170 -173.43,170 -173.43,126 -161.22,126
  region: -141.54,170 -153.74,170 -153.74,126 -141.54,126
  region: -121.85,170 -134.06,170 -134.06,126 -121.85,126
  region: -102.17,170 -114.37,170 -114.37,126 -102.17,126
  region: -82.48,170 -94.69,170 -94.69,126 -82.48,126
  region: -62.8,170 -75,170 -75,126 -62.8,126
  region: -43.11,170 -55.31,170 -55.31,126 -43.11,126
  region: -23.43,170 -35.63,170 -35.63,126 -23.43,126
  region: -3.74,170 -15.94,170 -15.94,126 -3.74,126
  region: 16,170 4,170 4,126 16,126
  region: 36,170 24,170 24,126 36,126
  region: 56,170 44,170 44,126 56,126
  region: 75,170 63,170 63,126 75,126
  region: 95,170 83,170 83,126 95,126
  region: 115,170 103,170 103,126 115,126
  region: 135,170 122,170 122,126 135,126
  region: 154,170 142,170 142,126 154,126
  region: 174,170 162,170 162,126 174,126
  region: 194,170 181,170 181,126 194,126
  region: 213,170 201,170 201,126 213,126
  region: 233,170 221,170 221,126 233,126
  region: 253,170 240,170 240,126 253,126
  region: 272,170 260,170 260,126 272,126
  rectangle: 260,-169.49 272,-125.79
  rectangle: 240,-169.49 253,-125.79
  rectangle: 221,-169.49 233,-125.79
  rectangle: 201,-169.49 213,-125.79
  rectangle: 181,-169.49 194,-125.79
  rectangle: 162,-169.49 174,-125.79
  rectangle: 142,-169.49 154,-125.79
  rectangle: 122,-169.49 135,-125.79
  rectangle: 103,-169.49 115,-125.79
  rectangle: 83,-169.49 95,-125.79
  rectangle: 63,-169.49 75,-125.79
  rectangle: 44,-169.49 56,-125.79
  rectangle: 24,-169.49 36,-125.79
  rectangle: 4,-169.49 16,-125.79
  rectangle: -15.94,-169.49 -3.74,-125.79
  rectangle: -35.63,-169.49 -23.43,-125.79
  rectangle: -55.31,-169.49 -43.11,-125.79
  rectangle: -75,-169.49 -62.8,-125.79
  rectangle: -94.69,-169.49 -82.48,-125.79
  rectangle: -114.37,-169.49 -102.17,-125.79
  rectangle: -134.06,-169.49 -121.85,-125.79
  rectangle: -153.74,-169.49 -141.54,-125.79
  rectangle: -173.43,-169.49 -161.22,-125.79
  rectangle: -193.11,-169.49 -180.91,-125.79
  rectangle: -212.8,-169.49 -200.59,-125.79
  rectangle: -232.48,-169.49 -220.28,-125.79
  rectangle: -252.17,-169.49 -239.96,-125.79
  rectangle: -271.85,-169.49 -259.65,-125.79
Mechanical 4:
  region: -261.42,164 -270.47,164 -270.47,122 -261.42,122
  region: -241.73,164 -250.79,164 -250.79,122 -241.73,122
  region: -222.05,164 -231.1,164 -231.1,122 -222.05,122
  region: -202.36,164 -211.42,164 -211.42,122 -202.36,122
  region: -182.68,164 -191.73,164 -191.73,122 -182.68,122
  region: -162.99,164 -172.05,164 -172.05,122 -162.99,122
  region: -143.31,164 -152.36,164 -152.36,122 -143.31,122
  region: -123.62,164 -132.68,164 -132.68,122 -123.62,122
  region: -103.94,164 -112.99,164 -112.99,122 -103.94,122
  region: -84.25,164 -93.31,164 -93.31,122 -84.25,122
  region: -64.57,164 -73.62,164 -73.62,122 -64.57,122
  region: -44.88,164 -53.94,164 -53.94,122 -44.88,122
  region: -25.2,164 -34.25,164 -34.25,122 -25.2,122
  region: -5.51,164 -14.57,164 -14.57,122 -5.51,122
  region: 15,164 6,164 6,122 15,122
  region: 34,164 25,164 25,122 34,122
  region: 54,164 45,164 45,122 54,122
  region: 74,164 65,164 65,122 74,122
  region: 93,164 84,164 84,122 93,122
  region: 113,164 104,164 104,122 113,122
  region: 133,164 124,164 124,122 133,122
  region: 152,164 143,164 143,122 152,122
  region: 172,164 163,164 163,122 172,122
  region: 192,164 183,164 183,122 192,122
  region: 212,164 202,164 202,122 212,122
  region: 231,164 222,164 222,122 231,122
  region: 251,164 242,164 242,122 251,122
  region: 271,164 262,164 262,122 271,122
  rectangle: 262,-163.39 271,-121.85
  rectangle: 242,-163.39 251,-121.85
  rectangle: 223,-163.39 232,-121.85
  rectangle: 203,-163.39 212,-121.85
  rectangle: 183,-163.39 192,-121.85
  rectangle: 163,-163.39 173,-121.85
  rectangle: 144,-163.39 153,-121.85
  rectangle: 124,-163.39 133,-121.85
  rectangle: 104,-163.39 113,-121.85
  rectangle: 85,-163.39 94,-121.85
  rectangle: 65,-163.39 74,-121.85
  rectangle: 45,-163.39 54,-121.85
  rectangle: 26,-163.39 35,-121.85
  rectangle: 6,-163.39 15,-121.85
  rectangle: -14.17,-163.39 -5.12,-121.85
  rectangle: -33.86,-163.39 -24.8,-121.85
  rectangle: -53.54,-163.39 -44.49,-121.85
  rectangle: -73.23,-163.39 -64.17,-121.85
  rectangle: -92.91,-163.39 -83.86,-121.85
  rectangle: -112.6,-163.39 -103.54,-121.85
  rectangle: -132.28,-163.39 -123.23,-121.85
  rectangle: -151.97,-163.39 -142.91,-121.85
  rectangle: -171.65,-163.39 -162.6,-121.85
  rectangle: -191.34,-163.39 -182.28,-121.85
  rectangle: -211.02,-163.39 -201.97,-121.85
  rectangle: -230.71,-163.39 -221.65,-121.85
  rectangle: -250.39,-163.39 -241.34,-121.85
  rectangle: -270.08,-163.39 -261.02,-121.85

## HTSSOP56DFD [mil]
pads (58):
  rect 12x44 smd: 1(-265.75,-147.64) 2(-246.06,-147.64) 3(-226.38,-147.64) 4(-206.69,-147.64) 5(-187.01,-147.64) 6(-167.32,-147.64) 7(-147.64,-147.64) 8(-127.95,-147.64) 9(-108.27,-147.64) 10(-88.58,-147.64) 11(-68.9,-147.64) 12(-49.21,-147.64) 13(-29.53,-147.64) 14(-9.84,-147.64) 15(10,-147.64) 16(30,-147.64) 17(50,-147.64) 18(69,-147.64) 19(89,-147.64) 20(109,-147.64) 21(128,-147.64) 22(148,-147.64) 23(168,-147.64) 24(188,-147.64) 25(207,-147.64) 26(227,-147.64) 27(247,-147.64) 28(266,-147.64) 29(266,148) 30(247,148) 31(227,148) 32(207,148) 33(188,148) 34(168,148) 35(148,148) 36(128,148) 37(109,148) 38(89,148) 39(69,148) 40(50,148) 41(30,148) 42(10,148) 43(-9.84,148) 44(-29.53,148) 45(-49.21,148) 46(-68.9,148) 47(-88.58,148) 48(-108.27,148) 49(-127.95,148) 50(-147.64,148) 51(-167.32,148) 52(-187.01,148) 53(-206.69,148) 54(-226.38,148) 55(-246.06,148) 56(-265.75,148)
  rect 276x201 smd: EXP@1(-137.8,0) EXP@2(138,0)
Top Overlay:
  circle w4: c-240.16,-86.61 r12
  lines w4: -275.59,-120.08 -275.59,121 276,121 276,-120.08 -275.59,-120.08
Top Paste:
  region: -260.24,169 -271.26,169 -271.26,127 -260.24,127
  region: -240.55,169 -251.57,169 -251.57,127 -240.55,127
  region: -220.87,169 -231.89,169 -231.89,127 -220.87,127
  region: -201.18,169 -212.2,169 -212.2,127 -201.18,127
  region: -181.5,169 -192.52,169 -192.52,127 -181.5,127
  region: -161.81,169 -172.83,169 -172.83,127 -161.81,127
  region: -142.13,169 -153.15,169 -153.15,127 -142.13,127
  region: -122.44,169 -133.46,169 -133.46,127 -122.44,127
  region: -102.76,169 -113.78,169 -113.78,127 -102.76,127
  region: -83.07,169 -94.09,169 -94.09,127 -83.07,127
  region: -63.39,169 -74.41,169 -74.41,127 -63.39,127
  region: -43.7,169 -54.72,169 -54.72,127 -43.7,127
  region: -24.02,169 -35.04,169 -35.04,127 -24.02,127
  region: -4.33,169 -15.35,169 -15.35,127 -4.33,127
  region: 16,169 5,169 5,127 16,127
  region: 36,169 25,169 25,127 36,127
  region: 55,169 44,169 44,127 55,127
  region: 75,169 64,169 64,127 75,127
  region: 95,169 84,169 84,127 95,127
  region: 114,169 103,169 103,127 114,127
  region: 134,169 123,169 123,127 134,127
  region: 154,169 143,169 143,127 154,127
  region: 173,169 162,169 162,127 173,127
  region: 193,169 182,169 182,127 193,127
  region: 213,169 202,169 202,127 213,127
  region: 232,169 221,169 221,127 232,127
  region: 252,169 241,169 241,127 252,127
  region: 272,169 261,169 261,127 272,127
  rectangle: 261,-168.7 272,-126.57
  rectangle: 241,-168.7 252,-126.57
  rectangle: 221,-168.7 232,-126.57
  rectangle: 202,-168.7 213,-126.57
  rectangle: 182,-168.7 193,-126.57
  rectangle: 162,-168.7 173,-126.57
  rectangle: 143,-168.7 154,-126.57
  rectangle: 123,-168.7 134,-126.57
  rectangle: 103,-168.7 114,-126.57
  rectangle: 84,-168.7 95,-126.57
  rectangle: 64,-168.7 75,-126.57
  rectangle: 44,-168.7 55,-126.57
  rectangle: 25,-168.7 36,-126.57
  rectangle: 5,-168.7 16,-126.57
  rectangle: -15.35,-168.7 -4.33,-126.57
  rectangle: -35.04,-168.7 -24.02,-126.57
  rectangle: -54.72,-168.7 -43.7,-126.57
  rectangle: -74.41,-168.7 -63.39,-126.57
  rectangle: -94.09,-168.7 -83.07,-126.57
  rectangle: -113.78,-168.7 -102.76,-126.57
  rectangle: -133.46,-168.7 -122.44,-126.57
  rectangle: -153.15,-168.7 -142.13,-126.57
  rectangle: -172.83,-168.7 -161.81,-126.57
  rectangle: -192.52,-168.7 -181.5,-126.57
  rectangle: -212.2,-168.7 -201.18,-126.57
  rectangle: -231.89,-168.7 -220.87,-126.57
  rectangle: -251.57,-168.7 -240.55,-126.57
  rectangle: -271.26,-168.7 -260.24,-126.57
Top Solder:
  rectangle: -275.59,-98.43 276,99
  region: -259.65,170 -271.85,170 -271.85,126 -259.65,126
  region: -239.96,170 -252.17,170 -252.17,126 -239.96,126
  region: -220.28,170 -232.48,170 -232.48,126 -220.28,126
  region: -200.59,170 -212.8,170 -212.8,126 -200.59,126
  region: -180.91,170 -193.11,170 -193.11,126 -180.91,126
  region: -161.22,170 -173.43,170 -173.43,126 -161.22,126
  region: -141.54,170 -153.74,170 -153.74,126 -141.54,126
  region: -121.85,170 -134.06,170 -134.06,126 -121.85,126
  region: -102.17,170 -114.37,170 -114.37,126 -102.17,126
  region: -82.48,170 -94.69,170 -94.69,126 -82.48,126
  region: -62.8,170 -75,170 -75,126 -62.8,126
  region: -43.11,170 -55.31,170 -55.31,126 -43.11,126
  region: -23.43,170 -35.63,170 -35.63,126 -23.43,126
  region: -3.74,170 -15.94,170 -15.94,126 -3.74,126
  region: 16,170 4,170 4,126 16,126
  region: 36,170 24,170 24,126 36,126
  region: 56,170 44,170 44,126 56,126
  region: 75,170 63,170 63,126 75,126
  region: 95,170 83,170 83,126 95,126
  region: 115,170 103,170 103,126 115,126
  region: 135,170 122,170 122,126 135,126
  region: 154,170 142,170 142,126 154,126
  region: 174,170 162,170 162,126 174,126
  region: 194,170 181,170 181,126 194,126
  region: 213,170 201,170 201,126 213,126
  region: 233,170 221,170 221,126 233,126
  region: 253,170 240,170 240,126 253,126
  region: 272,170 260,170 260,126 272,126
  rectangle: 260,-169.49 272,-125.79
  rectangle: 240,-169.49 253,-125.79
  rectangle: 221,-169.49 233,-125.79
  rectangle: 201,-169.49 213,-125.79
  rectangle: 181,-169.49 194,-125.79
  rectangle: 162,-169.49 174,-125.79
  rectangle: 142,-169.49 154,-125.79
  rectangle: 122,-169.49 135,-125.79
  rectangle: 103,-169.49 115,-125.79
  rectangle: 83,-169.49 95,-125.79
  rectangle: 63,-169.49 75,-125.79
  rectangle: 44,-169.49 56,-125.79
  rectangle: 24,-169.49 36,-125.79
  rectangle: 4,-169.49 16,-125.79
  rectangle: -15.94,-169.49 -3.74,-125.79
  rectangle: -35.63,-169.49 -23.43,-125.79
  rectangle: -55.31,-169.49 -43.11,-125.79
  rectangle: -75,-169.49 -62.8,-125.79
  rectangle: -94.69,-169.49 -82.48,-125.79
  rectangle: -114.37,-169.49 -102.17,-125.79
  rectangle: -134.06,-169.49 -121.85,-125.79
  rectangle: -153.74,-169.49 -141.54,-125.79
  rectangle: -173.43,-169.49 -161.22,-125.79
  rectangle: -193.11,-169.49 -180.91,-125.79
  rectangle: -212.8,-169.49 -200.59,-125.79
  rectangle: -232.48,-169.49 -220.28,-125.79
  rectangle: -252.17,-169.49 -239.96,-125.79
  rectangle: -271.85,-169.49 -259.65,-125.79
Mechanical 4:
  region: -261.42,164 -270.47,164 -270.47,122 -261.42,122
  region: -241.73,164 -250.79,164 -250.79,122 -241.73,122
  region: -222.05,164 -231.1,164 -231.1,122 -222.05,122
  region: -202.36,164 -211.42,164 -211.42,122 -202.36,122
  region: -182.68,164 -191.73,164 -191.73,122 -182.68,122
  region: -162.99,164 -172.05,164 -172.05,122 -162.99,122
  region: -143.31,164 -152.36,164 -152.36,122 -143.31,122
  region: -123.62,164 -132.68,164 -132.68,122 -123.62,122
  region: -103.94,164 -112.99,164 -112.99,122 -103.94,122
  region: -84.25,164 -93.31,164 -93.31,122 -84.25,122
  region: -64.57,164 -73.62,164 -73.62,122 -64.57,122
  region: -44.88,164 -53.94,164 -53.94,122 -44.88,122
  region: -25.2,164 -34.25,164 -34.25,122 -25.2,122
  region: -5.51,164 -14.57,164 -14.57,122 -5.51,122
  region: 15,164 6,164 6,122 15,122
  region: 34,164 25,164 25,122 34,122
  region: 54,164 45,164 45,122 54,122
  region: 74,164 65,164 65,122 74,122
  region: 93,164 84,164 84,122 93,122
  region: 113,164 104,164 104,122 113,122
  region: 133,164 124,164 124,122 133,122
  region: 152,164 143,164 143,122 152,122
  region: 172,164 163,164 163,122 172,122
  region: 192,164 183,164 183,122 192,122
  region: 212,164 202,164 202,122 212,122
  region: 231,164 222,164 222,122 231,122
  region: 251,164 242,164 242,122 251,122
  region: 271,164 262,164 262,122 271,122
  rectangle: 262,-163.39 271,-121.85
  rectangle: 242,-163.39 251,-121.85
  rectangle: 223,-163.39 232,-121.85
  rectangle: 203,-163.39 212,-121.85
  rectangle: 183,-163.39 192,-121.85
  rectangle: 163,-163.39 173,-121.85
  rectangle: 144,-163.39 153,-121.85
  rectangle: 124,-163.39 133,-121.85
  rectangle: 104,-163.39 113,-121.85
  rectangle: 85,-163.39 94,-121.85
  rectangle: 65,-163.39 74,-121.85
  rectangle: 45,-163.39 54,-121.85
  rectangle: 26,-163.39 35,-121.85
  rectangle: 6,-163.39 15,-121.85
  rectangle: -14.17,-163.39 -5.12,-121.85
  rectangle: -33.86,-163.39 -24.8,-121.85
  rectangle: -53.54,-163.39 -44.49,-121.85
  rectangle: -73.23,-163.39 -64.17,-121.85
  rectangle: -92.91,-163.39 -83.86,-121.85
  rectangle: -112.6,-163.39 -103.54,-121.85
  rectangle: -132.28,-163.39 -123.23,-121.85
  rectangle: -151.97,-163.39 -142.91,-121.85
  rectangle: -171.65,-163.39 -162.6,-121.85
  rectangle: -191.34,-163.39 -182.28,-121.85
  rectangle: -211.02,-163.39 -201.97,-121.85
  rectangle: -230.71,-163.39 -221.65,-121.85
  rectangle: -250.39,-163.39 -241.34,-121.85
  rectangle: -270.08,-163.39 -261.02,-121.85